# Altium integrated library Samtec_2,54_mm_Pitch_Socket_Strips.IntLib: 489 symbols (part 2 of 4) (continued)
## SMH-125-02-T-D (continued)
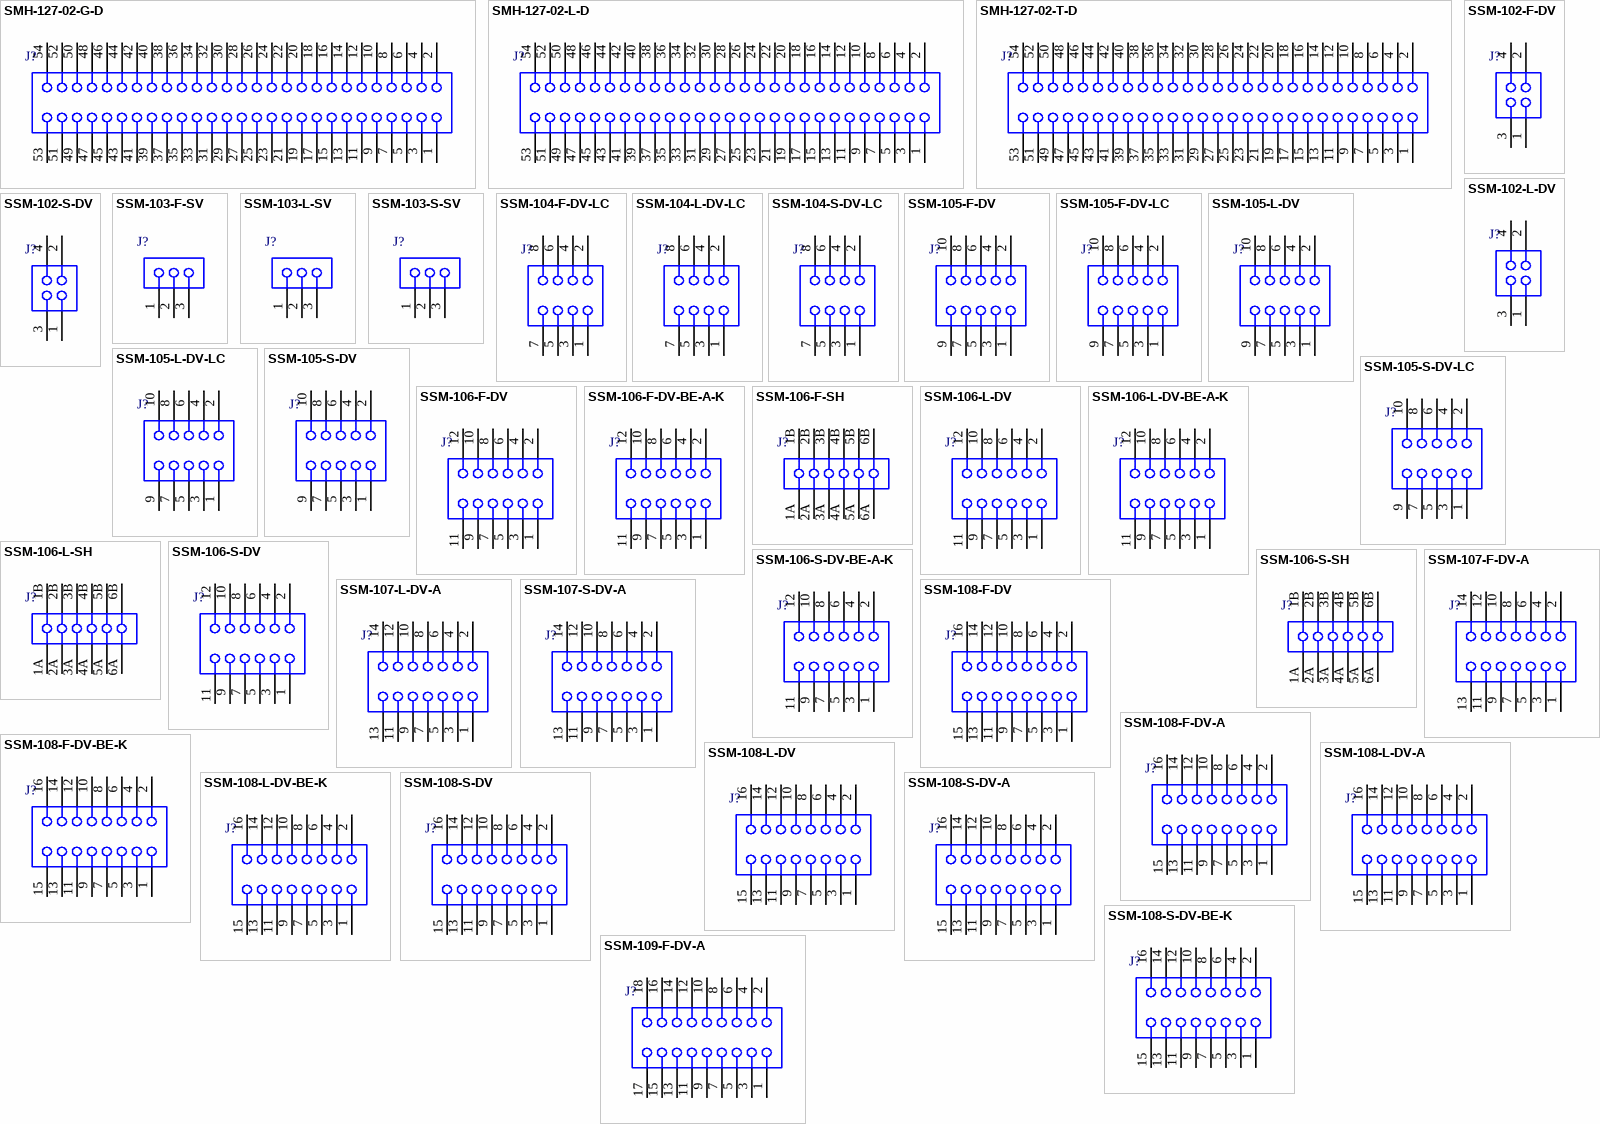
[diagram p5: symbols SMH-127-02-G-D to SSM-109-F-DV-A]

## SMH-127-02-G-D
designator J?
SMT Horizontal Socket, -55 to 125 degC, 2.54 mm Pitch, 54-Pin, Female, RoHS; Manufacturer: Samtec; PartNumber: SMH-127-02-G-D; Pitch: 2.54 mm; DatasheetVersion: F-214; PackageVersion: AF, 2/1999; PackageReference: SMH-127-02-X-D; PackageDescription: .100 [2.54] Horizontal SMT Socket Assembly; Orientation: Horizontal; RoHS: True; Temperature Range: -55 to 125 degC; Mounting Technology: Surface Mount; ComponentLink1Description: Manufacturer URL; ComponentLink1URL: http://www.samtec.com; ComponentLink2Description: Datasheet; ComponentLink2URL: http://www.samtec.com/documents/webfiles/pdf/SMH.PDF; ComponentLink3Description: Package Specification; ComponentLink3URL: http://www.samtec.com/documents/webfiles/cpdf/SMH-1XX-XX-XX-X-XX-MKT.pdf
footprint SMTC-SMH-127-02-X-D (Horizontal SMT Socket Assembly, 2x27 Pins, 2.54mm Pitch, Female)
pins: 1, 2, 3, 4, 5, 6, 7, 8, 9, 10, 11, 12, 13, 14, 15, 16, 17, 18, 19, 20, 21, 22, 23, 24, 25, 26, 27, 28, 29, 30, 31, 32, 33, 34, 35, 36, 37, 38, 39, 40, 41, 42, 43, 44, 45, 46, 47, 48, 49, 50, 51, 52, 53, 54

## SMH-127-02-L-D
designator J?
SMT Horizontal Socket, -55 to 125 degC, 2.54 mm Pitch, 54-Pin, Female, RoHS; Manufacturer: Samtec; PartNumber: SMH-127-02-L-D; Pitch: 2.54 mm; DatasheetVersion: F-214; PackageVersion: AF, 2/1999; PackageReference: SMH-127-02-X-D; PackageDescription: .100 [2.54] Horizontal SMT Socket Assembly; Orientation: Horizontal; RoHS: True; Temperature Range: -55 to 125 degC; Mounting Technology: Surface Mount; ComponentLink1Description: Manufacturer URL; ComponentLink1URL: http://www.samtec.com; ComponentLink2Description: Datasheet; ComponentLink2URL: http://www.samtec.com/documents/webfiles/pdf/SMH.PDF; ComponentLink3Description: Package Specification; ComponentLink3URL: http://www.samtec.com/documents/webfiles/cpdf/SMH-1XX-XX-XX-X-XX-MKT.pdf
footprint SMTC-SMH-127-02-X-D (Horizontal SMT Socket Assembly, 2x27 Pins, 2.54mm Pitch, Female)
pins: 1, 2, 3, 4, 5, 6, 7, 8, 9, 10, 11, 12, 13, 14, 15, 16, 17, 18, 19, 20, 21, 22, 23, 24, 25, 26, 27, 28, 29, 30, 31, 32, 33, 34, 35, 36, 37, 38, 39, 40, 41, 42, 43, 44, 45, 46, 47, 48, 49, 50, 51, 52, 53, 54

## SMH-127-02-T-D
designator J?
SMT Horizontal Socket, -55 to 105 degC, 2.54 mm Pitch, 54-Pin, Female, RoHS; Manufacturer: Samtec; PartNumber: SMH-127-02-T-D; Pitch: 2.54 mm; DatasheetVersion: F-214; PackageVersion: AF, 2/1999; PackageReference: SMH-127-02-X-D; PackageDescription: .100 [2.54] Horizontal SMT Socket Assembly; Orientation: Horizontal; RoHS: True; Temperature Range: -55 to 105 degC; Mounting Technology: Surface Mount; ComponentLink1Description: Manufacturer URL; ComponentLink1URL: http://www.samtec.com; ComponentLink2Description: Datasheet; ComponentLink2URL: http://www.samtec.com/documents/webfiles/pdf/SMH.PDF; ComponentLink3Description: Package Specification; ComponentLink3URL: http://www.samtec.com/documents/webfiles/cpdf/SMH-1XX-XX-XX-X-XX-MKT.pdf
footprint SMTC-SMH-127-02-X-D (Horizontal SMT Socket Assembly, 2x27 Pins, 2.54mm Pitch, Female)
pins: 1, 2, 3, 4, 5, 6, 7, 8, 9, 10, 11, 12, 13, 14, 15, 16, 17, 18, 19, 20, 21, 22, 23, 24, 25, 26, 27, 28, 29, 30, 31, 32, 33, 34, 35, 36, 37, 38, 39, 40, 41, 42, 43, 44, 45, 46, 47, 48, 49, 50, 51, 52, 53, 54

## SSM-102-F-DV
designator J?
Tiger Claw(TM) Surface Mount Socket, Vertical, -55 to 125 degC, 2.54 mm Pitch, 4-Pin, Female, RoHS; Manufacturer: Samtec; PartNumber: SSM-102-F-DV; Pitch: 2.54 mm; DatasheetVersion: F-214; PackageVersion: AK, 3/2000; PackageReference: SSM-102-X-DV; PackageDescription: .100 C.L. Double Vertical SMT Socket Strip; Orientation: Vertical; RoHS: True; Temperature Range: -55 to 125 degC; Mounting Technology: Surface Mount; ComponentLink1Description: Manufacturer URL; ComponentLink1URL: http://www.samtec.com; ComponentLink2Description: Datasheet; ComponentLink2URL: http://www.samtec.com/documents/webfiles/pdf/SSM_SM.PDF; ComponentLink3Description: Package Specification; ComponentLink3URL: http://www.samtec.com/documents/webfiles/cpdf/SSM-1XX-XXX-DV-XX-XX-X-XX-MKT.pdf
footprint SMTC-SSM-102-X-DV (C.L. Double Vertical SMT Socket Strip, 2x2 Pins, 2.54mm Pitch, Female)
pins: 1, 2, 3, 4

## SSM-102-L-DV
designator J?
Tiger Claw(TM) Surface Mount Socket, Vertical, -55 to 125 degC, 2.54 mm Pitch, 4-Pin, Female, RoHS; Manufacturer: Samtec; PartNumber: SSM-102-L-DV; Pitch: 2.54 mm; DatasheetVersion: F-214; PackageVersion: AK, 3/2000; PackageReference: SSM-102-X-DV; PackageDescription: .100 C.L. Double Vertical SMT Socket Strip; Supplier 1: Digi-Key; Supplier Part Number 1: SAM1146-02-ND; Supplier 2: Farnell; Supplier Part Number 2: 1668241; Supplier 3: Newark; Supplier Part Number 3: 11P7841; Supplier 4: Newark; Supplier Part Number 4: 15P2783; Orientation: Vertical; RoHS: True; Temperature Range: -55 to 125 degC; Mounting Technology: Surface Mount; ComponentLink1Description: Manufacturer URL; ComponentLink1URL: http://www.samtec.com; ComponentLink2Description: Datasheet; ComponentLink2URL: http://www.samtec.com/documents/webfiles/pdf/SSM_SM.PDF; ComponentLink3Description: Package Specification; ComponentLink3URL: http://www.samtec.com/documents/webfiles/cpdf/SSM-1XX-XXX-DV-XX-XX-X-XX-MKT.pdf
footprint SMTC-SSM-102-X-DV (C.L. Double Vertical SMT Socket Strip, 2x2 Pins, 2.54mm Pitch, Female)
pins: 1, 2, 3, 4

## SSM-102-S-DV
designator J?
Tiger Claw(TM) Surface Mount Socket, Vertical, -55 to 125 degC, 2.54 mm Pitch, 4-Pin, Female, RoHS; Manufacturer: Samtec; PartNumber: SSM-102-S-DV; Pitch: 2.54 mm; DatasheetVersion: F-214; PackageVersion: AK, 3/2000; PackageReference: SSM-102-X-DV; PackageDescription: .100 C.L. Double Vertical SMT Socket Strip; Supplier 1: Digi-Key; Supplier Part Number 1: SAM1150-02-ND; Supplier 2: Newark; Supplier Part Number 2: 11P7845; Orientation: Vertical; RoHS: True; Temperature Range: -55 to 125 degC; Mounting Technology: Surface Mount; ComponentLink1Description: Manufacturer URL; ComponentLink1URL: http://www.samtec.com; ComponentLink2Description: Datasheet; ComponentLink2URL: http://www.samtec.com/documents/webfiles/pdf/SSM_SM.PDF; ComponentLink3Description: Package Specification; ComponentLink3URL: http://www.samtec.com/documents/webfiles/cpdf/SSM-1XX-XXX-DV-XX-XX-X-XX-MKT.pdf
footprint SMTC-SSM-102-X-DV (C.L. Double Vertical SMT Socket Strip, 2x2 Pins, 2.54mm Pitch, Female)
pins: 1, 2, 3, 4

## SSM-103-F-SV
designator J?
Tiger Claw(TM) Surface Mount Socket, Vertical, -55 to 125 degC, 2.54 mm Pitch, 3-Pin, Female, RoHS; Manufacturer: Samtec; PartNumber: SSM-103-F-SV; Pitch: 2.54 mm; DatasheetVersion: F-214; PackageVersion: CR, 9/1998; PackageReference: SSM-103-X-SV; PackageDescription: .100 C.L. Surface Mount Socket Strip; Orientation: Vertical; RoHS: True; Temperature Range: -55 to 125 degC; Mounting Technology: Surface Mount; ComponentLink1Description: Manufacturer URL; ComponentLink1URL: http://www.samtec.com; ComponentLink2Description: Datasheet; ComponentLink2URL: http://www.samtec.com/documents/webfiles/pdf/SSM_SM.PDF; ComponentLink3Description: Package Specification; ComponentLink3URL: http://www.samtec.com/documents/webfiles/cpdf/SSM-1XX-XXX-XX-XX-XX-X-XX-XX-MKT.pdf
footprint SMTC-SSM-103-X-SV (C.L. Surface Mount Socket Strip, 3 Pins, Vertical, 2.54 mm Pitch, Female)
pins: 1, 2, 3

## SSM-103-L-SV
designator J?
Tiger Claw(TM) Surface Mount Socket, Vertical, -55 to 125 degC, 2.54 mm Pitch, 3-Pin, Female, RoHS; Manufacturer: Samtec; PartNumber: SSM-103-L-SV; Pitch: 2.54 mm; DatasheetVersion: F-214; PackageVersion: CR, 9/1998; PackageReference: SSM-103-X-SV; PackageDescription: .100 C.L. Surface Mount Socket Strip; Supplier 1: Digi-Key; Supplier Part Number 1: SAM1148-03-ND; Supplier 2: Newark; Supplier Part Number 2: 11P7851; Orientation: Vertical; RoHS: True; Temperature Range: -55 to 125 degC; Mounting Technology: Surface Mount; ComponentLink1Description: Manufacturer URL; ComponentLink1URL: http://www.samtec.com; ComponentLink2Description: Datasheet; ComponentLink2URL: http://www.samtec.com/documents/webfiles/pdf/SSM_SM.PDF; ComponentLink3Description: Package Specification; ComponentLink3URL: http://www.samtec.com/documents/webfiles/cpdf/SSM-1XX-XXX-XX-XX-XX-X-XX-XX-MKT.pdf
footprint SMTC-SSM-103-X-SV (C.L. Surface Mount Socket Strip, 3 Pins, Vertical, 2.54 mm Pitch, Female)
pins: 1, 2, 3

## SSM-103-S-SV
designator J?
Tiger Claw(TM) Surface Mount Socket, Vertical, -55 to 125 degC, 2.54 mm Pitch, 3-Pin, Female, RoHS; Manufacturer: Samtec; PartNumber: SSM-103-S-SV; Pitch: 2.54 mm; DatasheetVersion: F-214; PackageVersion: CR, 9/1998; PackageReference: SSM-103-X-SV; PackageDescription: .100 C.L. Surface Mount Socket Strip; Supplier 1: Digi-Key; Supplier Part Number 1: SAM1152-03-ND; Orientation: Vertical; RoHS: True; Temperature Range: -55 to 125 degC; Mounting Technology: Surface Mount; ComponentLink1Description: Manufacturer URL; ComponentLink1URL: http://www.samtec.com; ComponentLink2Description: Datasheet; ComponentLink2URL: http://www.samtec.com/documents/webfiles/pdf/SSM_SM.PDF; ComponentLink3Description: Package Specification; ComponentLink3URL: http://www.samtec.com/documents/webfiles/cpdf/SSM-1XX-XXX-XX-XX-XX-X-XX-XX-MKT.pdf
footprint SMTC-SSM-103-X-SV (C.L. Surface Mount Socket Strip, 3 Pins, Vertical, 2.54 mm Pitch, Female)
pins: 1, 2, 3

## SSM-104-F-DV-LC
designator J?
Tiger Claw(TM) Surface Mount Socket, Vertical, -55 to 125 degC, 2.54 mm Pitch, 8-Pin, Female, RoHS; Manufacturer: Samtec; PartNumber: SSM-104-F-DV-LC; Pitch: 2.54 mm; DatasheetVersion: F-214; PackageVersion: AK, 3/2000; PackageReference: SSM-104-X-DV-LC; PackageDescription: .100 C.L. Double Vertical SMT Socket Strip; Orientation: Vertical; RoHS: True; Temperature Range: -55 to 125 degC; Mounting Technology: Surface Mount; ComponentLink1Description: Manufacturer URL; ComponentLink1URL: http://www.samtec.com; ComponentLink2Description: Datasheet; ComponentLink2URL: http://www.samtec.com/documents/webfiles/pdf/SSM_SM.PDF; ComponentLink3Description: Package Specification; ComponentLink3URL: http://www.samtec.com/documents/webfiles/cpdf/SSM-1XX-XXX-DV-XX-XX-X-XX-MKT.pdf
footprint SMTC-SSM-104-X-DV-LC (C.L. Double Vertical SMT Socket Strip, 2x4 Pins, 2.54mm Pitch, Female)
pins: 1, 2, 3, 4, 5, 6, 7, 8

## SSM-104-L-DV-LC
designator J?
Tiger Claw(TM) Surface Mount Socket, Vertical, -55 to 125 degC, 2.54 mm Pitch, 8-Pin, Female, RoHS; Manufacturer: Samtec; PartNumber: SSM-104-L-DV-LC; Pitch: 2.54 mm; DatasheetVersion: F-214; PackageVersion: AK, 3/2000; PackageReference: SSM-104-X-DV-LC; PackageDescription: .100 C.L. Double Vertical SMT Socket Strip; Supplier 1: Newark; Supplier Part Number 1: 81P3359; Orientation: Vertical; RoHS: True; Temperature Range: -55 to 125 degC; Mounting Technology: Surface Mount; ComponentLink1Description: Manufacturer URL; ComponentLink1URL: http://www.samtec.com; ComponentLink2Description: Datasheet; ComponentLink2URL: http://www.samtec.com/documents/webfiles/pdf/SSM_SM.PDF; ComponentLink3Description: Package Specification; ComponentLink3URL: http://www.samtec.com/documents/webfiles/cpdf/SSM-1XX-XXX-DV-XX-XX-X-XX-MKT.pdf
footprint SMTC-SSM-104-X-DV-LC (C.L. Double Vertical SMT Socket Strip, 2x4 Pins, 2.54mm Pitch, Female)
pins: 1, 2, 3, 4, 5, 6, 7, 8

## SSM-104-S-DV-LC
designator J?
Tiger Claw(TM) Surface Mount Socket, Vertical, -55 to 125 degC, 2.54 mm Pitch, 8-Pin, Female, RoHS; Manufacturer: Samtec; PartNumber: SSM-104-S-DV-LC; Pitch: 2.54 mm; DatasheetVersion: F-214; PackageVersion: AK, 3/2000; PackageReference: SSM-104-X-DV-LC; PackageDescription: .100 C.L. Double Vertical SMT Socket Strip; Supplier 1: Newark; Supplier Part Number 1: 81P3437; Orientation: Vertical; RoHS: True; Temperature Range: -55 to 125 degC; Mounting Technology: Surface Mount; ComponentLink1Description: Manufacturer URL; ComponentLink1URL: http://www.samtec.com; ComponentLink2Description: Datasheet; ComponentLink2URL: http://www.samtec.com/documents/webfiles/pdf/SSM_SM.PDF; ComponentLink3Description: Package Specification; ComponentLink3URL: http://www.samtec.com/documents/webfiles/cpdf/SSM-1XX-XXX-DV-XX-XX-X-XX-MKT.pdf
footprint SMTC-SSM-104-X-DV-LC (C.L. Double Vertical SMT Socket Strip, 2x4 Pins, 2.54mm Pitch, Female)
pins: 1, 2, 3, 4, 5, 6, 7, 8

## SSM-105-F-DV
designator J?
Tiger Claw(TM) Surface Mount Socket, Vertical, -55 to 125 degC, 2.54 mm Pitch, 10-Pin, Female, RoHS; Manufacturer: Samtec; PartNumber: SSM-105-F-DV; Pitch: 2.54 mm; DatasheetVersion: F-214; PackageVersion: AK, 3/2000; PackageReference: SSM-105-X-DV; PackageDescription: .100 C.L. Double Vertical SMT Socket Strip; Orientation: Vertical; RoHS: True; Temperature Range: -55 to 125 degC; Mounting Technology: Surface Mount; ComponentLink1Description: Manufacturer URL; ComponentLink1URL: http://www.samtec.com; ComponentLink2Description: Datasheet; ComponentLink2URL: http://www.samtec.com/documents/webfiles/pdf/SSM_SM.PDF; ComponentLink3Description: Package Specification; ComponentLink3URL: http://www.samtec.com/documents/webfiles/cpdf/SSM-1XX-XXX-DV-XX-XX-X-XX-MKT.pdf
footprint SMTC-SSM-105-X-DV (C.L. Double Vertical SMT Socket Strip, 2x5 Pins, 2.54mm Pitch, Female)
pins: 1, 2, 3, 4, 5, 6, 7, 8, 9, 10

## SSM-105-F-DV-LC
designator J?
Tiger Claw(TM) Surface Mount Socket, Vertical, -55 to 125 degC, 2.54 mm Pitch, 10-Pin, Female, RoHS; Manufacturer: Samtec; PartNumber: SSM-105-F-DV-LC; Pitch: 2.54 mm; DatasheetVersion: F-214; PackageVersion: AK, 3/2000; PackageReference: SSM-105-X-DV-LC; PackageDescription: .100 C.L. Double Vertical SMT Socket Strip; Orientation: Vertical; RoHS: True; Temperature Range: -55 to 125 degC; Mounting Technology: Surface Mount; ComponentLink1Description: Manufacturer URL; ComponentLink1URL: http://www.samtec.com; ComponentLink2Description: Datasheet; ComponentLink2URL: http://www.samtec.com/documents/webfiles/pdf/SSM_SM.PDF; ComponentLink3Description: Package Specification; ComponentLink3URL: http://www.samtec.com/documents/webfiles/cpdf/SSM-1XX-XXX-DV-XX-XX-X-XX-MKT.pdf
footprint SMTC-SSM-105-X-DV-LC (C.L. Double Vertical SMT Socket Strip, 2x5 Pins, 2.54mm Pitch, Female)
pins: 1, 2, 3, 4, 5, 6, 7, 8, 9, 10

## SSM-105-L-DV
designator J?
Tiger Claw(TM) Surface Mount Socket, Vertical, -55 to 125 degC, 2.54 mm Pitch, 10-Pin, Female, RoHS; Manufacturer: Samtec; PartNumber: SSM-105-L-DV; Pitch: 2.54 mm; DatasheetVersion: F-214; PackageVersion: AK, 3/2000; PackageReference: SSM-105-X-DV; PackageDescription: .100 C.L. Double Vertical SMT Socket Strip; Supplier 1: Digi-Key; Supplier Part Number 1: SAM1146-05-ND; Supplier 2: Farnell; Supplier Part Number 2: 1668253; Supplier 3: Newark; Supplier Part Number 3: 15P2793; Supplier 4: Newark; Supplier Part Number 4: 11P7865; Orientation: Vertical; RoHS: True; Temperature Range: -55 to 125 degC; Mounting Technology: Surface Mount; ComponentLink1Description: Manufacturer URL; ComponentLink1URL: http://www.samtec.com; ComponentLink2Description: Datasheet; ComponentLink2URL: http://www.samtec.com/documents/webfiles/pdf/SSM_SM.PDF; ComponentLink3Description: Package Specification; ComponentLink3URL: http://www.samtec.com/documents/webfiles/cpdf/SSM-1XX-XXX-DV-XX-XX-X-XX-MKT.pdf
footprint SMTC-SSM-105-X-DV (C.L. Double Vertical SMT Socket Strip, 2x5 Pins, 2.54mm Pitch, Female)
pins: 1, 2, 3, 4, 5, 6, 7, 8, 9, 10

## SSM-105-L-DV-LC
designator J?
Tiger Claw(TM) Surface Mount Socket, Vertical, -55 to 125 degC, 2.54 mm Pitch, 10-Pin, Female, RoHS; Manufacturer: Samtec; PartNumber: SSM-105-L-DV-LC; Pitch: 2.54 mm; DatasheetVersion: F-214; PackageVersion: AK, 3/2000; PackageReference: SSM-105-X-DV-LC; PackageDescription: .100 C.L. Double Vertical SMT Socket Strip; Orientation: Vertical; RoHS: True; Temperature Range: -55 to 125 degC; Mounting Technology: Surface Mount; ComponentLink1Description: Manufacturer URL; ComponentLink1URL: http://www.samtec.com; ComponentLink2Description: Datasheet; ComponentLink2URL: http://www.samtec.com/documents/webfiles/pdf/SSM_SM.PDF; ComponentLink3Description: Package Specification; ComponentLink3URL: http://www.samtec.com/documents/webfiles/cpdf/SSM-1XX-XXX-DV-XX-XX-X-XX-MKT.pdf
footprint SMTC-SSM-105-X-DV-LC (C.L. Double Vertical SMT Socket Strip, 2x5 Pins, 2.54mm Pitch, Female)
pins: 1, 2, 3, 4, 5, 6, 7, 8, 9, 10

## SSM-105-S-DV
designator J?
Tiger Claw(TM) Surface Mount Socket, Vertical, -55 to 125 degC, 2.54 mm Pitch, 10-Pin, Female, RoHS; Manufacturer: Samtec; PartNumber: SSM-105-S-DV; Pitch: 2.54 mm; DatasheetVersion: F-214; PackageVersion: AK, 3/2000; PackageReference: SSM-105-X-DV; PackageDescription: .100 C.L. Double Vertical SMT Socket Strip; Supplier 1: Digi-Key; Supplier Part Number 1: SAM1150-05-ND; Supplier 2: Newark; Supplier Part Number 2: 11P7869; Orientation: Vertical; RoHS: True; Temperature Range: -55 to 125 degC; Mounting Technology: Surface Mount; ComponentLink1Description: Manufacturer URL; ComponentLink1URL: http://www.samtec.com; ComponentLink2Description: Datasheet; ComponentLink2URL: http://www.samtec.com/documents/webfiles/pdf/SSM_SM.PDF; ComponentLink3Description: Package Specification; ComponentLink3URL: http://www.samtec.com/documents/webfiles/cpdf/SSM-1XX-XXX-DV-XX-XX-X-XX-MKT.pdf
footprint SMTC-SSM-105-X-DV (C.L. Double Vertical SMT Socket Strip, 2x5 Pins, 2.54mm Pitch, Female)
pins: 1, 2, 3, 4, 5, 6, 7, 8, 9, 10

## SSM-105-S-DV-LC
designator J?
Tiger Claw(TM) Surface Mount Socket, Vertical, -55 to 125 degC, 2.54 mm Pitch, 10-Pin, Female, RoHS; Manufacturer: Samtec; PartNumber: SSM-105-S-DV-LC; Pitch: 2.54 mm; DatasheetVersion: F-214; PackageVersion: AK, 3/2000; PackageReference: SSM-105-X-DV-LC; PackageDescription: .100 C.L. Double Vertical SMT Socket Strip; Supplier 1: Newark; Supplier Part Number 1: 81P3730; Orientation: Vertical; RoHS: True; Temperature Range: -55 to 125 degC; Mounting Technology: Surface Mount; ComponentLink1Description: Manufacturer URL; ComponentLink1URL: http://www.samtec.com; ComponentLink2Description: Datasheet; ComponentLink2URL: http://www.samtec.com/documents/webfiles/pdf/SSM_SM.PDF; ComponentLink3Description: Package Specification; ComponentLink3URL: http://www.samtec.com/documents/webfiles/cpdf/SSM-1XX-XXX-DV-XX-XX-X-XX-MKT.pdf
footprint SMTC-SSM-105-X-DV-LC (C.L. Double Vertical SMT Socket Strip, 2x5 Pins, 2.54mm Pitch, Female)
pins: 1, 2, 3, 4, 5, 6, 7, 8, 9, 10

## SSM-106-F-DV
designator J?
Tiger Claw(TM) Surface Mount Socket, Vertical, -55 to 125 degC, 2.54 mm Pitch, 12-Pin, Female, RoHS; Manufacturer: Samtec; PartNumber: SSM-106-F-DV; Pitch: 2.54 mm; DatasheetVersion: F-214; PackageVersion: AK, 3/2000; PackageReference: SSM-106-X-DV; PackageDescription: .100 C.L. Double Vertical SMT Socket Strip; Orientation: Vertical; RoHS: True; Temperature Range: -55 to 125 degC; Mounting Technology: Surface Mount; ComponentLink1Description: Manufacturer URL; ComponentLink1URL: http://www.samtec.com; ComponentLink2Description: Datasheet; ComponentLink2URL: http://www.samtec.com/documents/webfiles/pdf/SSM_SM.PDF; ComponentLink3Description: Package Specification; ComponentLink3URL: http://www.samtec.com/documents/webfiles/cpdf/SSM-1XX-XXX-DV-XX-XX-X-XX-MKT.pdf
footprint SMTC-SSM-106-X-DV (C.L. Double Vertical SMT Socket Strip, 2x6 Pins, 2.54mm Pitch, Female)
pins: 1, 2, 3, 4, 5, 6, 7, 8, 9, 10, 11, 12

## SSM-106-F-DV-BE-A-K
designator J?
Tiger Claw(TM) Surface Mount Socket, Vertical, -55 to 125 degC, 2.54 mm Pitch, 12-Pin, Female, RoHS; Manufacturer: Samtec; PartNumber: SSM-106-F-DV-BE-A-K; Pitch: 2.54 mm; DatasheetVersion: F-214; PackageVersion: AK, 3/2000; PackageReference: SSM-106-X-DV-BE-A-K; PackageDescription: .100 C.L. Double Vertical SMT Socket Strip; Orientation: Vertical; RoHS: True; Temperature Range: -55 to 125 degC; Mounting Technology: Surface Mount; ComponentLink1Description: Manufacturer URL; ComponentLink1URL: http://www.samtec.com; ComponentLink2Description: Datasheet; ComponentLink2URL: http://www.samtec.com/documents/webfiles/pdf/SSM_SM.PDF; ComponentLink3Description: Package Specification; ComponentLink3URL: http://www.samtec.com/documents/webfiles/cpdf/SSM-1XX-XXX-DV-XX-XX-X-XX-MKT.pdf
footprint SMTC-SSM-106-X-DV-BE-A-K (C.L. Double Vertical SMT Socket Strip, 2x6 Pins, 2.54mm Pitch, Female)
pins: 1, 2, 3, 4, 5, 6, 7, 8, 9, 10, 11, 12

## SSM-106-F-SH
designator J?
Tiger Claw(TM) Surface Mount Socket, Horizontal, -55 to 125 degC, 2.54 mm Pitch, 12-Pin, Female, RoHS; Manufacturer: Samtec; PartNumber: SSM-106-F-SH; Pitch: 2.54 mm; DatasheetVersion: F-214; PackageVersion: CR, 9/1998; PackageReference: SSM-106-X-SH; PackageDescription: .100 C.L. Surface Mount Socket Strip; Orientation: Horizontal; RoHS: True; Temperature Range: -55 to 125 degC; Mounting Technology: Surface Mount; ComponentLink1Description: Manufacturer URL; ComponentLink1URL: http://www.samtec.com; ComponentLink2Description: Datasheet; ComponentLink2URL: http://www.samtec.com/documents/webfiles/pdf/SSM_SM.PDF; ComponentLink3Description: Package Specification; ComponentLink3URL: http://www.samtec.com/documents/webfiles/cpdf/SSM-1XX-XXX-XX-XX-XX-X-XX-XX-MKT.pdf
footprint SMTC-SSM-106-X-SH (C.L. Surface Mount Socket Strip, 2x6 Pins, Horizontal, 2.54 mm Pitch, Female)
pins: 1A, 1B, 2A, 2B, 3A, 3B, 4A, 4B, 5A, 5B, 6A, 6B

## SSM-106-L-DV
designator J?
Tiger Claw(TM) Surface Mount Socket, Vertical, -55 to 125 degC, 2.54 mm Pitch, 12-Pin, Female, RoHS; Manufacturer: Samtec; PartNumber: SSM-106-L-DV; Pitch: 2.54 mm; DatasheetVersion: F-214; PackageVersion: AK, 3/2000; PackageReference: SSM-106-X-DV; PackageDescription: .100 C.L. Double Vertical SMT Socket Strip; Supplier 1: Digi-Key; Supplier Part Number 1: SAM1146-06-ND; Supplier 2: Farnell; Supplier Part Number 2: 1668255; Supplier 3: Newark; Supplier Part Number 3: 11P7873; Supplier 4: Newark; Supplier Part Number 4: 15P2795; Orientation: Vertical; RoHS: True; Temperature Range: -55 to 125 degC; Mounting Technology: Surface Mount; ComponentLink1Description: Manufacturer URL; ComponentLink1URL: http://www.samtec.com; ComponentLink2Description: Datasheet; ComponentLink2URL: http://www.samtec.com/documents/webfiles/pdf/SSM_SM.PDF; ComponentLink3Description: Package Specification; ComponentLink3URL: http://www.samtec.com/documents/webfiles/cpdf/SSM-1XX-XXX-DV-XX-XX-X-XX-MKT.pdf
footprint SMTC-SSM-106-X-DV (C.L. Double Vertical SMT Socket Strip, 2x6 Pins, 2.54mm Pitch, Female)
pins: 1, 2, 3, 4, 5, 6, 7, 8, 9, 10, 11, 12

## SSM-106-L-DV-BE-A-K
designator J?
Tiger Claw(TM) Surface Mount Socket, Vertical, -55 to 125 degC, 2.54 mm Pitch, 12-Pin, Female, RoHS; Manufacturer: Samtec; PartNumber: SSM-106-L-DV-BE-A-K; Pitch: 2.54 mm; DatasheetVersion: F-214; PackageVersion: AK, 3/2000; PackageReference: SSM-106-X-DV-BE-A-K; PackageDescription: .100 C.L. Double Vertical SMT Socket Strip; Orientation: Vertical; RoHS: True; Temperature Range: -55 to 125 degC; Mounting Technology: Surface Mount; ComponentLink1Description: Manufacturer URL; ComponentLink1URL: http://www.samtec.com; ComponentLink2Description: Datasheet; ComponentLink2URL: http://www.samtec.com/documents/webfiles/pdf/SSM_SM.PDF; ComponentLink3Description: Package Specification; ComponentLink3URL: http://www.samtec.com/documents/webfiles/cpdf/SSM-1XX-XXX-DV-XX-XX-X-XX-MKT.pdf
footprint SMTC-SSM-106-X-DV-BE-A-K (C.L. Double Vertical SMT Socket Strip, 2x6 Pins, 2.54mm Pitch, Female)
pins: 1, 2, 3, 4, 5, 6, 7, 8, 9, 10, 11, 12

## SSM-106-L-SH
designator J?
Tiger Claw(TM) Surface Mount Socket, Horizontal, -55 to 125 degC, 2.54 mm Pitch, 12-Pin, Female, RoHS; Manufacturer: Samtec; PartNumber: SSM-106-L-SH; Pitch: 2.54 mm; DatasheetVersion: F-214; PackageVersion: CR, 9/1998; PackageReference: SSM-106-X-SH; PackageDescription: .100 C.L. Surface Mount Socket Strip; Supplier 1: Digi-Key; Supplier Part Number 1: SAM1147-06-ND; Supplier 2: Farnell; Supplier Part Number 2: 1668256; Supplier 3: Newark; Supplier Part Number 3: 11P7874; Orientation: Horizontal; RoHS: True; Temperature Range: -55 to 125 degC; Mounting Technology: Surface Mount; ComponentLink1Description: Manufacturer URL; ComponentLink1URL: http://www.samtec.com; ComponentLink2Description: Datasheet; ComponentLink2URL: http://www.samtec.com/documents/webfiles/pdf/SSM_SM.PDF; ComponentLink3Description: Package Specification; ComponentLink3URL: http://www.samtec.com/documents/webfiles/cpdf/SSM-1XX-XXX-XX-XX-XX-X-XX-XX-MKT.pdf
footprint SMTC-SSM-106-X-SH (C.L. Surface Mount Socket Strip, 2x6 Pins, Horizontal, 2.54 mm Pitch, Female)
pins: 1A, 1B, 2A, 2B, 3A, 3B, 4A, 4B, 5A, 5B, 6A, 6B

## SSM-106-S-DV
designator J?
Tiger Claw(TM) Surface Mount Socket, Vertical, -55 to 125 degC, 2.54 mm Pitch, 12-Pin, Female, RoHS; Manufacturer: Samtec; PartNumber: SSM-106-S-DV; Pitch: 2.54 mm; DatasheetVersion: F-214; PackageVersion: AK, 3/2000; PackageReference: SSM-106-X-DV; PackageDescription: .100 C.L. Double Vertical SMT Socket Strip; Supplier 1: Digi-Key; Supplier Part Number 1: SAM1150-06-ND; Supplier 2: Newark; Supplier Part Number 2: 11P7877; Orientation: Vertical; RoHS: True; Temperature Range: -55 to 125 degC; Mounting Technology: Surface Mount; ComponentLink1Description: Manufacturer URL; ComponentLink1URL: http://www.samtec.com; ComponentLink2Description: Datasheet; ComponentLink2URL: http://www.samtec.com/documents/webfiles/pdf/SSM_SM.PDF; ComponentLink3Description: Package Specification; ComponentLink3URL: http://www.samtec.com/documents/webfiles/cpdf/SSM-1XX-XXX-DV-XX-XX-X-XX-MKT.pdf
footprint SMTC-SSM-106-X-DV (C.L. Double Vertical SMT Socket Strip, 2x6 Pins, 2.54mm Pitch, Female)
pins: 1, 2, 3, 4, 5, 6, 7, 8, 9, 10, 11, 12

## SSM-106-S-DV-BE-A-K
designator J?
Tiger Claw(TM) Surface Mount Socket, Vertical, -55 to 125 degC, 2.54 mm Pitch, 12-Pin, Female, RoHS; Manufacturer: Samtec; PartNumber: SSM-106-S-DV-BE-A-K; Pitch: 2.54 mm; DatasheetVersion: F-214; PackageVersion: AK, 3/2000; PackageReference: SSM-106-X-DV-BE-A-K; PackageDescription: .100 C.L. Double Vertical SMT Socket Strip; Orientation: Vertical; RoHS: True; Temperature Range: -55 to 125 degC; Mounting Technology: Surface Mount; ComponentLink1Description: Manufacturer URL; ComponentLink1URL: http://www.samtec.com; ComponentLink2Description: Datasheet; ComponentLink2URL: http://www.samtec.com/documents/webfiles/pdf/SSM_SM.PDF; ComponentLink3Description: Package Specification; ComponentLink3URL: http://www.samtec.com/documents/webfiles/cpdf/SSM-1XX-XXX-DV-XX-XX-X-XX-MKT.pdf
footprint SMTC-SSM-106-X-DV-BE-A-K (C.L. Double Vertical SMT Socket Strip, 2x6 Pins, 2.54mm Pitch, Female)
pins: 1, 2, 3, 4, 5, 6, 7, 8, 9, 10, 11, 12

## SSM-106-S-SH
designator J?
Tiger Claw(TM) Surface Mount Socket, Horizontal, -55 to 125 degC, 2.54 mm Pitch, 12-Pin, Female, RoHS; Manufacturer: Samtec; PartNumber: SSM-106-S-SH; Pitch: 2.54 mm; DatasheetVersion: F-214; PackageVersion: CR, 9/1998; PackageReference: SSM-106-X-SH; PackageDescription: .100 C.L. Surface Mount Socket Strip; Supplier 1: Digi-Key; Supplier Part Number 1: SAM1151-06-ND; Orientation: Horizontal; RoHS: True; Temperature Range: -55 to 125 degC; Mounting Technology: Surface Mount; ComponentLink1Description: Manufacturer URL; ComponentLink1URL: http://www.samtec.com; ComponentLink2Description: Datasheet; ComponentLink2URL: http://www.samtec.com/documents/webfiles/pdf/SSM_SM.PDF; ComponentLink3Description: Package Specification; ComponentLink3URL: http://www.samtec.com/documents/webfiles/cpdf/SSM-1XX-XXX-XX-XX-XX-X-XX-XX-MKT.pdf
footprint SMTC-SSM-106-X-SH (C.L. Surface Mount Socket Strip, 2x6 Pins, Horizontal, 2.54 mm Pitch, Female)
pins: 1A, 1B, 2A, 2B, 3A, 3B, 4A, 4B, 5A, 5B, 6A, 6B

## SSM-107-F-DV-A
designator J?
Tiger Claw(TM) Surface Mount Socket, Vertical, -55 to 125 degC, 2.54 mm Pitch, 14-Pin, Female, RoHS; Manufacturer: Samtec; PartNumber: SSM-107-F-DV-A; Pitch: 2.54 mm; DatasheetVersion: F-214; PackageVersion: AK, 3/2000; PackageReference: SSM-107-X-DV-A; PackageDescription: .100 C.L. Double Vertical SMT Socket Strip; Orientation: Vertical; RoHS: True; Temperature Range: -55 to 125 degC; Mounting Technology: Surface Mount; ComponentLink1Description: Manufacturer URL; ComponentLink1URL: http://www.samtec.com; ComponentLink2Description: Datasheet; ComponentLink2URL: http://www.samtec.com/documents/webfiles/pdf/SSM_SM.PDF; ComponentLink3Description: Package Specification; ComponentLink3URL: http://www.samtec.com/documents/webfiles/cpdf/SSM-1XX-XXX-DV-XX-XX-X-XX-MKT.pdf
footprint SMTC-SSM-107-X-DV-A (C.L. Double Vertical SMT Socket Strip, 2x7 Pins, 2.54mm Pitch, Female)
pins: 1, 2, 3, 4, 5, 6, 7, 8, 9, 10, 11, 12, 13, 14

## SSM-107-L-DV-A
designator J?
Tiger Claw(TM) Surface Mount Socket, Vertical, -55 to 125 degC, 2.54 mm Pitch, 14-Pin, Female, RoHS; Manufacturer: Samtec; PartNumber: SSM-107-L-DV-A; Pitch: 2.54 mm; DatasheetVersion: F-214; PackageVersion: AK, 3/2000; PackageReference: SSM-107-X-DV-A; PackageDescription: .100 C.L. Double Vertical SMT Socket Strip; Orientation: Vertical; RoHS: True; Temperature Range: -55 to 125 degC; Mounting Technology: Surface Mount; ComponentLink1Description: Manufacturer URL; ComponentLink1URL: http://www.samtec.com; ComponentLink2Description: Datasheet; ComponentLink2URL: http://www.samtec.com/documents/webfiles/pdf/SSM_SM.PDF; ComponentLink3Description: Package Specification; ComponentLink3URL: http://www.samtec.com/documents/webfiles/cpdf/SSM-1XX-XXX-DV-XX-XX-X-XX-MKT.pdf
footprint SMTC-SSM-107-X-DV-A (C.L. Double Vertical SMT Socket Strip, 2x7 Pins, 2.54mm Pitch, Female)
pins: 1, 2, 3, 4, 5, 6, 7, 8, 9, 10, 11, 12, 13, 14

## SSM-107-S-DV-A
designator J?
Tiger Claw(TM) Surface Mount Socket, Vertical, -55 to 125 degC, 2.54 mm Pitch, 14-Pin, Female, RoHS; Manufacturer: Samtec; PartNumber: SSM-107-S-DV-A; Pitch: 2.54 mm; DatasheetVersion: F-214; PackageVersion: AK, 3/2000; PackageReference: SSM-107-X-DV-A; PackageDescription: .100 C.L. Double Vertical SMT Socket Strip; Orientation: Vertical; RoHS: True; Temperature Range: -55 to 125 degC; Mounting Technology: Surface Mount; ComponentLink1Description: Manufacturer URL; ComponentLink1URL: http://www.samtec.com; ComponentLink2Description: Datasheet; ComponentLink2URL: http://www.samtec.com/documents/webfiles/pdf/SSM_SM.PDF; ComponentLink3Description: Package Specification; ComponentLink3URL: http://www.samtec.com/documents/webfiles/cpdf/SSM-1XX-XXX-DV-XX-XX-X-XX-MKT.pdf
footprint SMTC-SSM-107-X-DV-A (C.L. Double Vertical SMT Socket Strip, 2x7 Pins, 2.54mm Pitch, Female)
pins: 1, 2, 3, 4, 5, 6, 7, 8, 9, 10, 11, 12, 13, 14

## SSM-108-F-DV
designator J?
Tiger Claw(TM) Surface Mount Socket, Vertical, -55 to 125 degC, 2.54 mm Pitch, 16-Pin, Female, RoHS; Manufacturer: Samtec; PartNumber: SSM-108-F-DV; Pitch: 2.54 mm; DatasheetVersion: F-214; PackageVersion: AK, 3/2000; PackageReference: SSM-108-X-DV; PackageDescription: .100 C.L. Double Vertical SMT Socket Strip; Supplier 1: Newark; Supplier Part Number 1: 81P4356; Orientation: Vertical; RoHS: True; Temperature Range: -55 to 125 degC; Mounting Technology: Surface Mount; ComponentLink1Description: Manufacturer URL; ComponentLink1URL: http://www.samtec.com; ComponentLink2Description: Datasheet; ComponentLink2URL: http://www.samtec.com/documents/webfiles/pdf/SSM_SM.PDF; ComponentLink3Description: Package Specification; ComponentLink3URL: http://www.samtec.com/documents/webfiles/cpdf/SSM-1XX-XXX-DV-XX-XX-X-XX-MKT.pdf
footprint SMTC-SSM-108-X-DV (C.L. Double Vertical SMT Socket Strip, 2x8 Pins, 2.54mm Pitch, Female)
pins: 1, 2, 3, 4, 5, 6, 7, 8, 9, 10, 11, 12, 13, 14, 15, 16

## SSM-108-F-DV-A
designator J?
Tiger Claw(TM) Surface Mount Socket, Vertical, -55 to 125 degC, 2.54 mm Pitch, 16-Pin, Female, RoHS; Manufacturer: Samtec; PartNumber: SSM-108-F-DV-A; Pitch: 2.54 mm; DatasheetVersion: F-214; PackageVersion: AK, 3/2000; PackageReference: SSM-108-X-DV-A; PackageDescription: .100 C.L. Double Vertical SMT Socket Strip; Orientation: Vertical; RoHS: True; Temperature Range: -55 to 125 degC; Mounting Technology: Surface Mount; ComponentLink1Description: Manufacturer URL; ComponentLink1URL: http://www.samtec.com; ComponentLink2Description: Datasheet; ComponentLink2URL: http://www.samtec.com/documents/webfiles/pdf/SSM_SM.PDF; ComponentLink3Description: Package Specification; ComponentLink3URL: http://www.samtec.com/documents/webfiles/cpdf/SSM-1XX-XXX-DV-XX-XX-X-XX-MKT.pdf
footprint SMTC-SSM-108-X-DV-A (C.L. Double Vertical SMT Socket Strip, 2x8 Pins, 2.54mm Pitch, Female)
pins: 1, 2, 3, 4, 5, 6, 7, 8, 9, 10, 11, 12, 13, 14, 15, 16

## SSM-108-F-DV-BE-K
designator J?
Tiger Claw(TM) Surface Mount Socket, Vertical, -55 to 125 degC, 2.54 mm Pitch, 16-Pin, Female, RoHS; Manufacturer: Samtec; PartNumber: SSM-108-F-DV-BE-K; Pitch: 2.54 mm; DatasheetVersion: F-214; PackageVersion: AK, 3/2000; PackageReference: SSM-108-X-DV-BE-K; PackageDescription: .100 C.L. Double Vertical SMT Socket Strip; Orientation: Vertical; RoHS: True; Temperature Range: -55 to 125 degC; Mounting Technology: Surface Mount; ComponentLink1Description: Manufacturer URL; ComponentLink1URL: http://www.samtec.com; ComponentLink2Description: Datasheet; ComponentLink2URL: http://www.samtec.com/documents/webfiles/pdf/SSM_SM.PDF; ComponentLink3Description: Package Specification; ComponentLink3URL: http://www.samtec.com/documents/webfiles/cpdf/SSM-1XX-XXX-DV-XX-XX-X-XX-MKT.pdf
footprint SMTC-SSM-108-X-DV-BE-K (C.L. Double Vertical SMT Socket Strip, 2x8 Pins, 2.54mm Pitch, Female)
pins: 1, 2, 3, 4, 5, 6, 7, 8, 9, 10, 11, 12, 13, 14, 15, 16

## SSM-108-L-DV
designator J?
Tiger Claw(TM) Surface Mount Socket, Vertical, -55 to 125 degC, 2.54 mm Pitch, 16-Pin, Female, RoHS; Manufacturer: Samtec; PartNumber: SSM-108-L-DV; Pitch: 2.54 mm; DatasheetVersion: F-214; PackageVersion: AK, 3/2000; PackageReference: SSM-108-X-DV; PackageDescription: .100 C.L. Double Vertical SMT Socket Strip; Supplier 1: Digi-Key; Supplier Part Number 1: SAM1146-08-ND; Supplier 2: Farnell; Supplier Part Number 2: 2308487; Supplier 3: Newark; Supplier Part Number 3: 70W0673; Supplier 4: Newark; Supplier Part Number 4: 11P7889; Orientation: Vertical; RoHS: True; Temperature Range: -55 to 125 degC; Mounting Technology: Surface Mount; ComponentLink1Description: Manufacturer URL; ComponentLink1URL: http://www.samtec.com; ComponentLink2Description: Datasheet; ComponentLink2URL: http://www.samtec.com/documents/webfiles/pdf/SSM_SM.PDF; ComponentLink3Description: Package Specification; ComponentLink3URL: http://www.samtec.com/documents/webfiles/cpdf/SSM-1XX-XXX-DV-XX-XX-X-XX-MKT.pdf
footprint SMTC-SSM-108-X-DV (C.L. Double Vertical SMT Socket Strip, 2x8 Pins, 2.54mm Pitch, Female)
pins: 1, 2, 3, 4, 5, 6, 7, 8, 9, 10, 11, 12, 13, 14, 15, 16

## SSM-108-L-DV-A
designator J?
Tiger Claw(TM) Surface Mount Socket, Vertical, -55 to 125 degC, 2.54 mm Pitch, 16-Pin, Female, RoHS; Manufacturer: Samtec; PartNumber: SSM-108-L-DV-A; Pitch: 2.54 mm; DatasheetVersion: F-214; PackageVersion: AK, 3/2000; PackageReference: SSM-108-X-DV-A; PackageDescription: .100 C.L. Double Vertical SMT Socket Strip; Orientation: Vertical; RoHS: True; Temperature Range: -55 to 125 degC; Mounting Technology: Surface Mount; ComponentLink1Description: Manufacturer URL; ComponentLink1URL: http://www.samtec.com; ComponentLink2Description: Datasheet; ComponentLink2URL: http://www.samtec.com/documents/webfiles/pdf/SSM_SM.PDF; ComponentLink3Description: Package Specification; ComponentLink3URL: http://www.samtec.com/documents/webfiles/cpdf/SSM-1XX-XXX-DV-XX-XX-X-XX-MKT.pdf
footprint SMTC-SSM-108-X-DV-A (C.L. Double Vertical SMT Socket Strip, 2x8 Pins, 2.54mm Pitch, Female)
pins: 1, 2, 3, 4, 5, 6, 7, 8, 9, 10, 11, 12, 13, 14, 15, 16
